# Altium footprint library Connector.PcbLib: 231 footprints (part 2 of 15)
Each footprint in its own frame and in the unit in brackets; x right, y up, seen from the top. Pads: shape width x height; smd on the part's side, far side on the other; paste and mask are expansions set on the pad; w line width, h text height; cw(c..) or ccw(c..) is an arc to the next point about the centre after c.
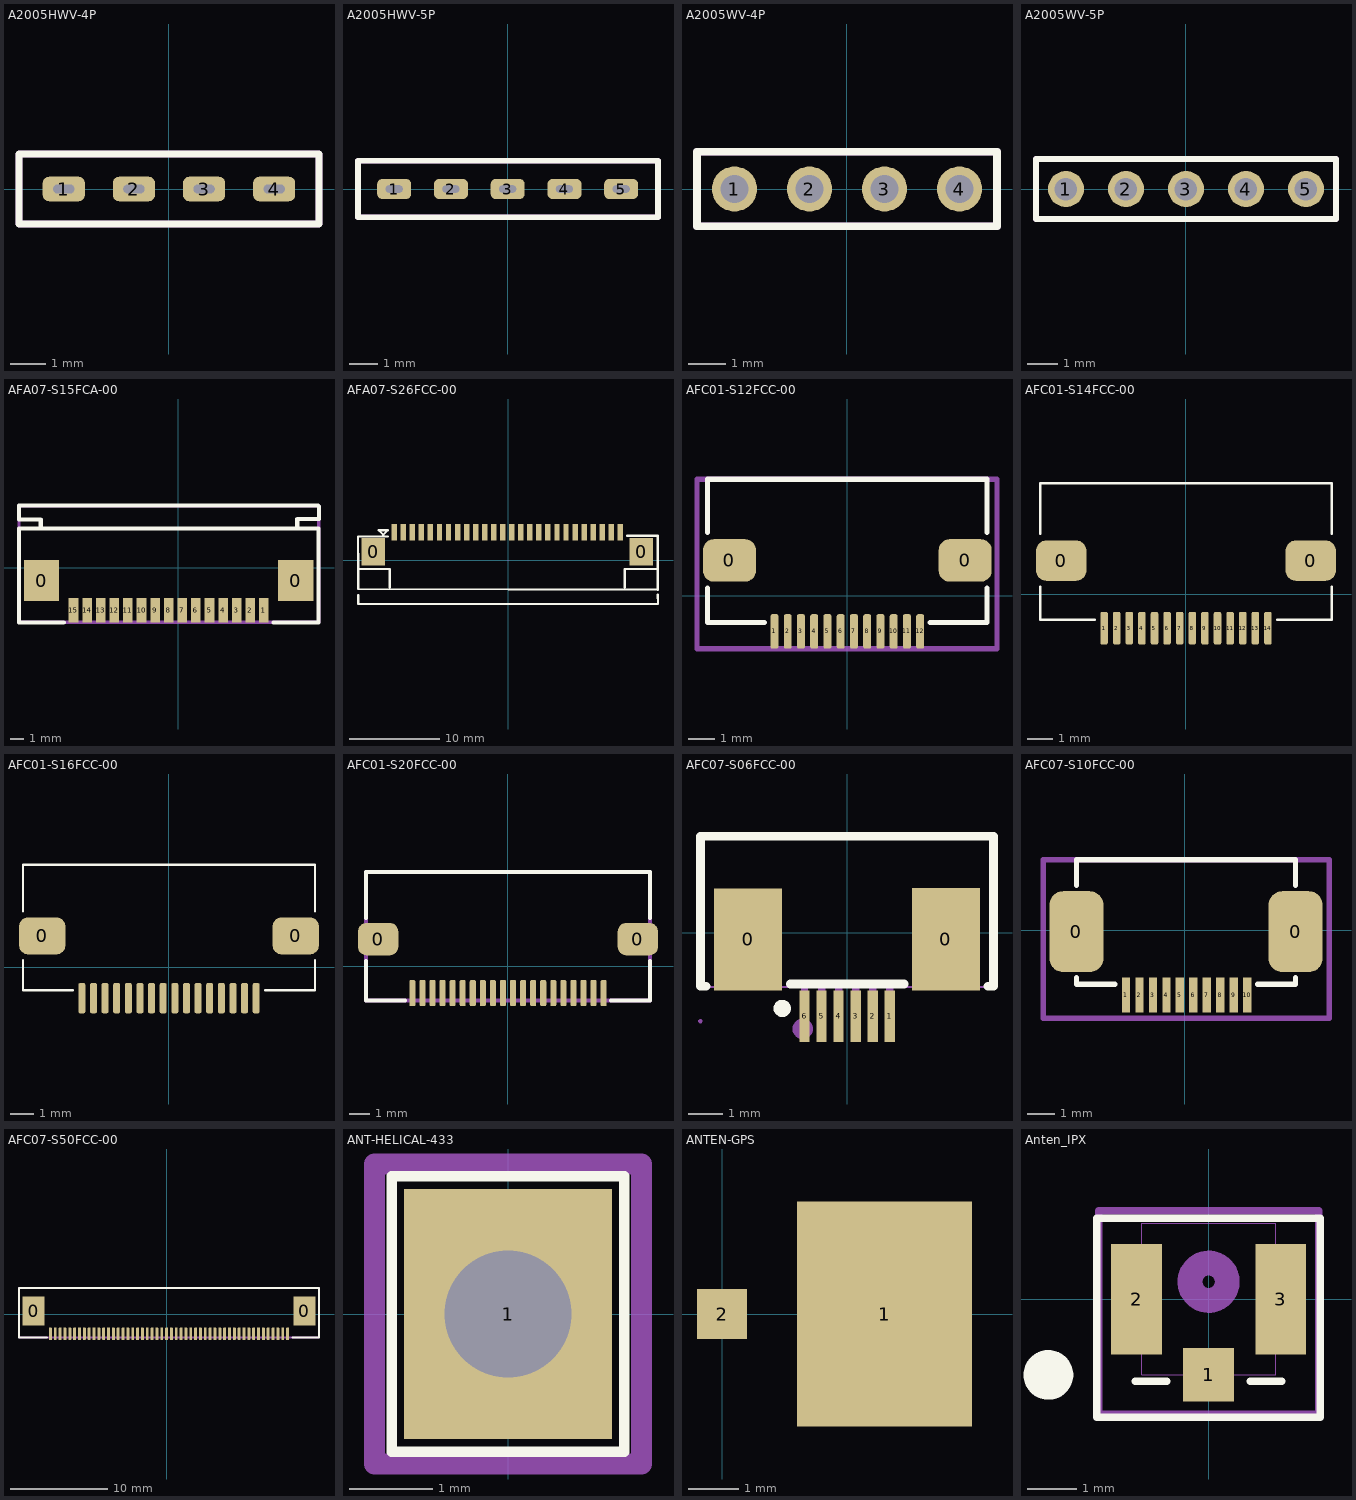
[diagram p1: the footprints below, top view; thin cyan lines are the x and y axes]

## A2005HWV-4P [mm]
pads (4):
  rrect50% 1.2x0.7 hole 0.25 slot 0.6 at 0 deg: 1(-3,0) 2(-1,0) 3(1,0) 4(3,0)
Top Overlay:
  lines w0.2: -4.277,-0.999 4.278,-0.999 4.278,1 -4.277,1 -4.277,-0.999
Mechanical 13:
  lines w0.2: -4.277,-0.999 4.278,-0.999 4.278,1 -4.277,1 -4.277,-0.999
  text ".Designator" at -3.1,-0.6 h1.5
3D body "MMS-104-01-F-SV.stp": height 4.44, standoff -2.92, extent -4.277,-0.999 4.278,1

## A2005HWV-5P [mm]
pads (5):
  rrect50% 1.2x0.7 hole 0.25 slot 0.6 at 0 deg: 1(-4,0) 2(-2,0) 3(0,0) 4(2,0) 5(4,0)
Top Overlay:
  lines w0.2: -5.277,-0.999 5.3,-0.999 5.3,1 -5.277,1 -5.277,-0.999
Mechanical 13:
  lines w0.2: -5.277,-0.999 5.3,-0.999 5.3,1 -5.277,1 -5.277,-0.999
  text ".Designator" at -4.1,-0.6 h1.5
3D body "MMS-105-01-F-SV.stp": height 4.44, standoff -2.92, extent -5.277,-0.999 5.277,1

## A2005WV-4P [mm]
pads (4):
  round 1.2 hole 0.75: 1(-3,0) 2(-1,0) 3(1,0) 4(3,0)
Top Overlay:
  lines w0.2: -4,-0.999 -4,1 4,1 4,-0.999 -4,-0.999
Mechanical 13:
  lines w0.2: -4,-0.999 -4,1 4,1 4,-0.999 -4,-0.999
  text ".Designator" at -3,-0.6 h1.5
3D body "TMM-104-03-T-S.stp": height 5.51, standoff -2.69, extent -4,-0.99 4,0.991

## A2005WV-5P [mm]
pads (5):
  round 1.2 hole 0.75: 1(-4,0) 2(-2,0) 3(0,0) 4(2,0) 5(4,0)
Top Overlay:
  lines w0.2: -5,-0.999 5,-0.999 5,1 -5,1 -5,-0.999
Mechanical 13:
  lines w0.2: -5,-0.999 5,-0.999 5,1 -5,1 -5,-0.999
  text ".Designator" at -4,-0.6 h1.5
3D body "TMM-105-03-T-S.stp": height 5.51, standoff -2.69, extent -5,-0.99 5,0.991

## AFA07-S15FCA-00 [mm]
pads (17):
  rect 2.6x3 smd: 0(-10.043,-0.946) 0(8.657,-0.946)
  rect 0.7x1.8 smd: 1(6.307,-3.116) 2(5.307,-3.116) 3(4.307,-3.116) 4(3.307,-3.116) 5(2.307,-3.116) 6(1.307,-3.116) 7(0.307,-3.116) 8(-0.693,-3.116) 9(-1.693,-3.116) 10(-2.693,-3.116) 11(-3.693,-3.116) 12(-4.693,-3.116) 13(-5.693,-3.116) 14(-6.693,-3.116) 15(-7.693,-3.116)
Top Overlay:
  lines w0.3: -11.7,4.54 -11.7,3.54 -10.1,3.54 -10.1,2.915 ; -11.7,4.559 6.232,4.559 10.282,4.559 ; -8.408,-4.016 -11.7,-4.016 -11.7,2.884 10.332,2.884 10.332,-4.016 7.015,-4.016 ; 8.757,2.959 8.757,3.584 8.857,3.584 10.357,3.584 10.357,4.484
Mechanical 13:
  lines w0.254: 10.332,4.559 -11.7,4.559 -11.7,-4.016 10.332,-4.016 10.332,4.559 ; 10.332,4.559 10.332,4.559
  text ".Designator" at -3.85,1.4 h1.5
3D body: height 2.5, standoff 0, extent -11.7,-2.591 10.332,4.559

## AFA07-S26FCC-00 [mm]
pads (28):
  rect 2.6x3 smd paste+0 mask+0.051: 0(-14.967,0.959) 0(14.733,0.959)
  rect 0.6x1.8 smd paste+0 mask+0.051: 1(-12.617,3.128) 2(-11.619,3.129) 3(-10.619,3.129) 4(-9.619,3.129) 5(-8.619,3.129) 6(-7.619,3.129) 7(-6.618,3.129) 8(-5.618,3.129) 9(-4.618,3.129) 10(-3.618,3.129) 11(-2.618,3.129) 12(-1.618,3.129) 13(-0.618,3.129) 14(0.382,3.129) 15(1.382,3.129) 16(2.382,3.129) 17(3.382,3.129) 18(4.382,3.129) 19(5.382,3.129) 20(6.382,3.129) 21(7.382,3.129) 22(8.382,3.129) 23(9.382,3.129) 24(10.382,3.129) 25(11.382,3.129) 26(12.382,3.129)
Top Overlay:
  lines w0.254: -16.617,-3.826 -16.617,-4.826 16.563,-4.816 16.55,-3.816 ; -13.317,2.644 -16.637,2.644 -16.617,-0.956 ; -13.117,-2.956 -13.117,-0.956 -16.617,-0.956 ; 12.883,-2.956 12.883,-0.956 16.383,-0.956 16.543,-0.956 ; 13.123,2.744 16.543,2.744 16.543,-0.956 ; -16.617,-0.956 -16.617,-3.176 16.543,-3.236 16.543,-0.956 ; -14.347,3.335 -13.846,3.335 -13.349,3.335 -13.846,2.834 -14.347,3.335
Mechanical 15:
  lines w0.003: -0.037,0.015 -0.037,0.016
3D body: height 2, standoff 0, extent -16.618,-4.821 16.543,2.61

## AFC01-S12FCC-00 [mm]
pads (14):
  rrect50% 2x1.6 smd: 0(-4.45,1.34) 0(4.45,1.34)
  rrect50% 0.3x1.3 smd: 1(-2.75,-1.34) 2(-2.25,-1.34) 3(-1.75,-1.34) 4(-1.25,-1.34) 5(-0.75,-1.34) 6(-0.25,-1.34) 7(0.25,-1.34) 8(0.75,-1.34) 9(1.25,-1.34) 10(1.75,-1.34) 11(2.25,-1.34) 12(2.75,-1.34)
Top Overlay:
  lines w0.2: -5.275,0.3 -5.275,-1 -3.125,-1 ; -5.275,2.4 -5.275,4.4 5.275,4.4 5.275,2.4 ; 3.125,-1 5.275,-1 5.275,0.3
Mechanical 13:
  lines w0.2: -5.675,-1.99 5.65,-1.99 5.65,4.4 -5.675,4.4 -5.675,-1.99
  text ".Designator" at -3.1,0.54 h1.5
3D body "687112149022_Download_STP_687112149022_rev1.stp": height 2.2, standoff -0.05, extent -5.05,-1.65 5.05,4.85

## AFC01-S14FCC-00 [mm]
pads (16):
  rrect50% 2x1.6 smd: 0(-4.95,1.34) 0(4.95,1.34)
  rrect50% 0.3x1.3 smd: 1(-3.25,-1.34) 2(-2.75,-1.34) 3(-2.25,-1.34) 4(-1.75,-1.34) 5(-1.25,-1.34) 6(-0.75,-1.34) 7(-0.25,-1.34) 8(0.25,-1.34) 9(0.75,-1.34) 10(1.25,-1.34) 11(1.75,-1.34) 12(2.25,-1.34) 13(2.75,-1.34) 14(3.25,-1.34)
Top Overlay:
  lines w0.1: -5.775,0.3 -5.775,-1 -3.625,-1 ; -5.775,2.4 -5.775,4.4 5.775,4.4 5.775,2.4 ; 3.625,-1 5.775,-1 5.775,0.3
Mechanical 13:
  text ".Designator" at -3.1,0.54 h1.5

## AFC01-S16FCC-00 [mm]
pads (18):
  rrect50% 2x1.6 smd: 0(-5.45,1.34) 0(5.45,1.34)
  rrect50% 0.3x1.3 smd: 1(-3.75,-1.34) 2(-3.25,-1.34) 3(-2.75,-1.34) 4(-2.25,-1.34) 5(-1.75,-1.34) 6(-1.25,-1.34) 7(-0.75,-1.34) 8(-0.25,-1.34) 9(0.25,-1.34) 10(0.75,-1.34) 11(1.25,-1.34) 12(1.75,-1.34) 13(2.25,-1.34) 14(2.75,-1.34) 15(3.25,-1.34) 16(3.75,-1.34)
Top Overlay:
  lines w0.1: -6.275,0.3 -6.275,-1 -4.125,-1 ; -6.275,2.4 -6.275,4.4 6.275,4.4 6.275,2.4 ; 4.125,-1 6.275,-1 6.275,0.3
Mechanical 13:
  text ".Designator" at -3.1,0.54 h1.5

## AFC01-S20FCC-00 [mm]
pads (22):
  rrect50% 2x1.6 smd: 0(-6.45,1.34) 0(6.45,1.34)
  rrect50% 0.3x1.3 smd: 1(-4.75,-1.34) 2(-4.25,-1.34) 3(-3.75,-1.34) 4(-3.25,-1.34) 5(-2.75,-1.34) 6(-2.25,-1.34) 7(-1.75,-1.34) 8(-1.25,-1.34) 9(-0.75,-1.34) 10(-0.25,-1.34) 11(0.25,-1.34) 12(0.75,-1.34) 13(1.25,-1.34) 14(1.75,-1.34) 15(2.25,-1.34) 16(2.75,-1.34) 17(3.25,-1.34) 18(3.75,-1.34) 19(4.25,-1.34) 20(4.75,-1.34)
Top Overlay:
  lines w0.2: -7.05,0.26 -7.05,-1.715 -5.125,-1.715 ; 5.125,-1.715 7.05,-1.715 7.05,0.26 ; 7.05,2.385 7.05,4.685 -7.05,4.685 -7.05,2.385 ; -7.05,2.385 -7.05,2.385
Mechanical 13:
  lines w0.2: -7.05,-1.715 7.05,-1.715 7.05,4.685 -7.05,4.685 -7.05,-1.715
  text ".Designator" at -3.1,0.54 h1.5
3D body "FH12-20S-0.5SH.stp": height 2.04, standoff -0.06, extent -7.05,-1.715 7.05,4.685

## AFC07-S06FCC-00 [mm]
pads (8):
  rect 2x3 smd paste+0 mask+0.051: 0(-2.902,-0.191) 0(2.901,-0.184)
  rect 0.3x1.5 smd paste+0 mask+0.051: 1(1.254,-2.445) 2(0.754,-2.445) 3(0.254,-2.445) 4(-0.246,-2.445) 5(-0.746,-2.445) 6(-1.246,-2.445)
Top Overlay:
  circle w0.254: c-1.901,-2.215 r0.127
  lines w0.254: -4.134,-1.561 -4.301,-1.561 -4.301,2.839 4.299,2.839 4.299,-1.561 4.131,-1.561 ; -1.67,-1.5 1.67,-1.5
Mechanical 6:
  circle w0.3: c-1.301,-2.815 r0.15
Mechanical 15:
  region: 1.949,1.042 3.749,1.042 3.749,-1.579 1.949,-1.579
  region: -3.752,1.035 -1.952,1.035 -1.952,-1.586 -3.752,-1.586
  region: -1.346,-1.536 -1.146,-1.536 -1.146,-2.586 -1.346,-2.586
  region: -0.846,-1.536 -0.646,-1.536 -0.646,-2.586 -0.846,-2.586
  region: -0.346,-1.536 -0.146,-1.536 -0.146,-2.586 -0.346,-2.586
  region: 0.154,-1.536 0.354,-1.536 0.354,-2.586 0.154,-2.586
  region: 0.654,-1.536 0.854,-1.536 0.854,-2.586 0.654,-2.586
  region: 1.154,-1.536 1.354,-1.536 1.354,-2.586 1.154,-2.586
  region: -4.241,-2.586 -4.241,-2.561 -4.276,-2.526 -4.326,-2.526 -4.361,-2.561 -4.361,-2.586 -4.361,-2.611 -4.325,-2.646 -4.276,-2.646 -4.241,-2.611
  lines w0.051: -4.301,-1.586 4.299,-1.586 4.299,2.814 -4.301,2.814 -4.301,-1.586

## AFC07-S10FCC-00 [mm]
pads (12):
  rrect50% 2x3 smd: 0(-4.025,-0.05) 0(4.1,-0.05)
  rect 0.3x1.3 smd: 1(-2.193,-2.405) 2(-1.693,-2.405) 3(-1.193,-2.405) 4(-0.693,-2.405) 5(-0.193,-2.405) 6(0.307,-2.405) 7(0.807,-2.405) 8(1.307,-2.405) 9(1.807,-2.405) 10(2.307,-2.405)
Top Overlay:
  lines w0.2: -4.025,-1.755 -4.025,-2 -2.6,-2 ; -4.025,1.675 -4.025,2.613 4.1,2.613 4.1,1.675 ; 2.7,-2 4.1,-2 4.1,-1.755
Mechanical 13:
  lines w0.2: -5.25,-3.255 5.35,-3.255 5.35,2.613 -5.25,2.613 -5.25,-3.255
  text ".Designator" at -4.847,0.801 h2
3D body "687112149022_Download_STP_687112149022_rev1.stp": height 2.2, standoff -0.05, extent -5,-3.375 5.1,3.125

## AFC07-S50FCC-00 [mm]
pads (52):
  rect 2.3x3 smd: 0(-13.75,0.34) 0(14.25,0.34)
  rrect50% 0.3x1.3 smd: 1(-12,-2) 2(-11.5,-2) 3(-11,-2) 4(-10.5,-2) 5(-10,-2) 6(-9.5,-2) 7(-9,-2) 8(-8.5,-2) 9(-8,-2) 10(-7.5,-2) 11(-7,-2) 12(-6.5,-2) 13(-6,-2) 14(-5.5,-2) 15(-5,-2) 16(-4.5,-2) 17(-4,-2) 18(-3.5,-2) 19(-3,-2) 20(-2.5,-2) 21(-2,-2) 22(-1.5,-2) 23(-1,-2) 24(-0.5,-2) 25(0,-2) 26(0.5,-2) 27(1,-2) 28(1.5,-2) 29(2,-2) 30(2.5,-2) 31(3,-2) 32(3.5,-2) 33(4,-2) 34(4.5,-2) 35(5,-2) 36(5.5,-2) 37(6,-2) 38(6.5,-2) 39(7,-2) 40(7.5,-2) 41(8,-2) 42(8.5,-2) 43(9,-2) 44(9.5,-2) 45(10,-2) 47(11,-2) 48(11.5,-2) 49(12,-2) 50(12.5,-2) 1746(10.5,-2)
Top Overlay:
  lines w0.2: -12.375,-2.375 -15.25,-2.375 -15.25,2.75 15.75,2.75 15.75,-2.375 13,-2.375
Mechanical 13:
  lines w0.2: -15.25,-2.375 15.75,-2.375 15.75,2.75 -15.25,2.75 -15.25,-2.375
  text ".Designator" at -3.075,0.34 h1.5
3D body: height 2, standoff 0, extent -15.25,-2.375 15.75,2.75

## ANT-HELICAL-433 [mm]
pads (1):
  rect 2.5x3 hole 1.52: 1(0,0)
Top Overlay:
  lines w0.127: -1.397,-1.651 -1.397,1.651 1.397,1.651 1.397,-1.651 -1.397,-1.651
Mechanical 13:
  lines w0.254: -1.6,-1.8 -1.6,1.8 1.6,1.8 1.6,-1.8 -1.6,-1.8
  text ".Designator" at -0.1,1.651 h1
Mechanical 15:
  lines w0.254: -1.6,-1.8 -1.6,1.8 1.6,1.8 1.6,-1.8 -1.6,-1.8
  text ".Comment" at -0.1,1.4 h1

## ANTEN-GPS [mm]
pads (2):
  rect 3.5x4.5 smd: 1(3.25,0)
  rect 1x1 smd: 2(0,0)

## Anten_IPX [mil]
pads (3):
  rect 41x43 smd paste+0 mask+0: 1(0,-61.02)
  rect 41x89 smd: 2(-58.07,0) 3(58.07,0)
Top Overlay:
  circle w20: c-129,-61.02 r10
  lines w6: -59,-66 -33.6,-66 ; 33.6,-66 59,-66 ; -90,-95 90,-95 90,65 -90,65 -90,-95
Mechanical 13:
  circle w20: c0,13.98 r15
  lines w1: -54,-61 -54,61 54,61 54,-61 -54,-61
Mechanical 15:
  lines w6: -88.57,-92.52 88.57,-92.52 88.57,71 -88.57,71 -88.57,-92.52
3D body "U.FL-R-SMT-1(80)--3DModel-STEP-1.STEP": height 49.71, standoff 0.5, extent -59.06,-61 59.06,61.05
3D body: height 10, standoff 0, extent 0,0 10,10